# Altium footprint library PBL - SMD Packages.PcbLib: 263 footprints (part 14 of 17)
Each footprint in its own frame and in the unit in brackets; x right, y up, seen from the top. Pads: shape width x height; smd on the part's side, far side on the other; paste and mask are expansions set on the pad; w line width, h text height; cw(c..) or ccw(c..) is an arc to the next point about the centre after c.
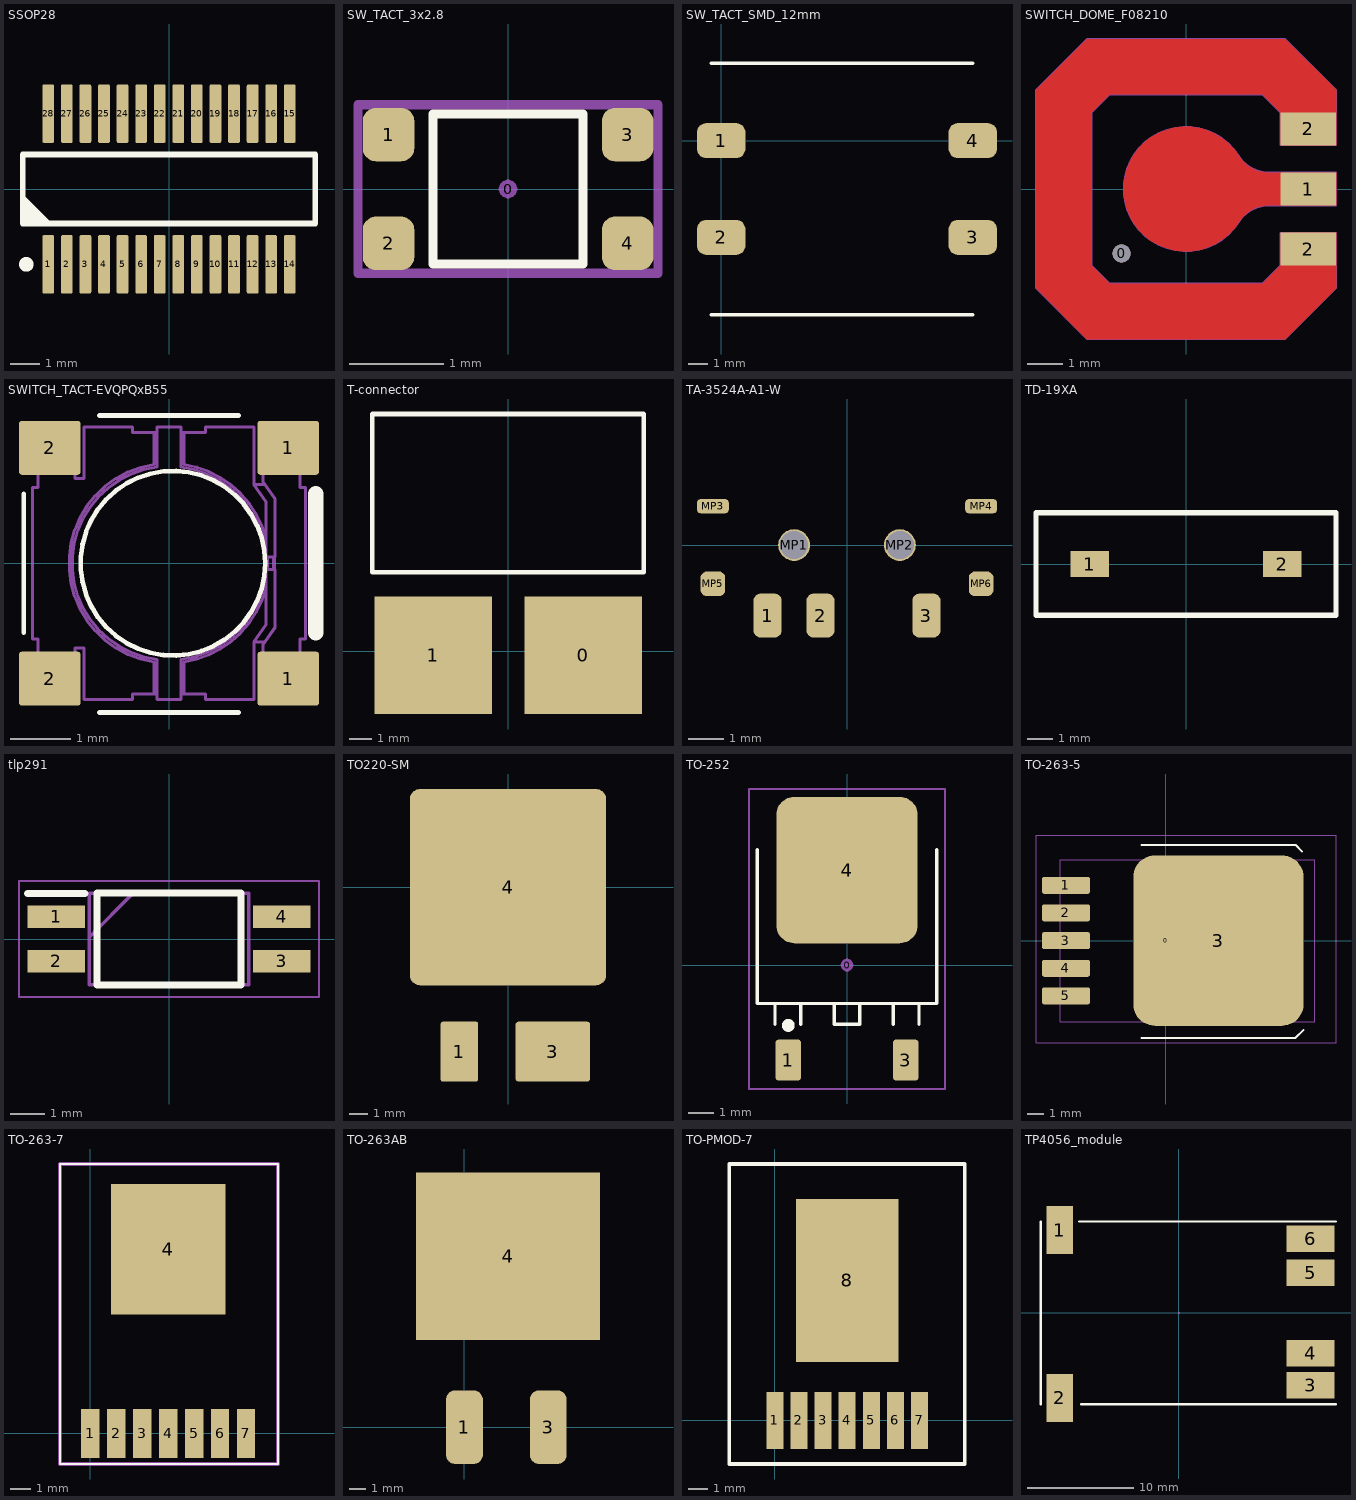
[diagram p13: the footprints below, top view; thin cyan lines are the x and y axes]

## SSOP28 [mm] "SSOP; 28 Leads; Body Width 3.9 mm; Pitch 0.635 mm"
height 1.75
pads (28):
  rrect25% 0.4x2 smd: 1(-4.127,-2.575) 2(-3.492,-2.575) 3(-2.857,-2.575) 4(-2.222,-2.575) 5(-1.587,-2.575) 6(-0.953,-2.575) 7(-0.318,-2.575) 8(0.318,-2.575) 9(0.953,-2.575) 10(1.587,-2.575) 11(2.222,-2.575) 12(2.857,-2.575) 13(3.492,-2.575) 14(4.127,-2.575) 15(4.127,2.575) 16(3.492,2.575) 17(2.857,2.575) 18(2.222,2.575) 19(1.587,2.575) 20(0.953,2.575) 21(0.318,2.575) 22(-0.318,2.575) 23(-0.953,2.575) 24(-1.587,2.575) 25(-2.222,2.575) 26(-2.857,2.575) 27(-3.492,2.575) 28(-4.127,2.575)
Top Overlay:
  circle w0.25: c-4.878,-2.575 r0.125
  region: -5,-1.175 -5,-0.175 -4,-1.175
  lines w0.2: -5,-1.175 -5,1.175 5,1.175 5,-1.175 -5,-1.175

## SW_TACT_3x2.8 [mm]
pads (5):
  round 0.2 on Mech15: 0(0,0)
  rrect50% 0.55x0.57 smd mask+0.05: 1(-1.274,0.58) 2(-1.274,-0.58) 3(1.276,0.58) 4(1.276,-0.58)
Top Overlay:
  lines w0.1: -0.8,-0.8 0.8,-0.8 0.8,0.8 -0.8,0.8 -0.8,-0.8
15 - Top Courtyards:
  lines w0.1: -1.6,-0.9 1.6,-0.9 1.6,0.9 -1.6,0.9 -1.6,-0.9

## SW_TACT_SMD_12mm [mm] "Tactile switch SMD 12x12mm"
pads (4):
  rrect50% 2.5x1.8 smd: 1(0,0) 2(0,-5) 3(13,-5) 4(13,0)
Top Overlay:
  lines w0.2: -0.5,-9 13,-9 ; -0.5,4 13,4
3D body "TACT SWITCH.STEP": height 7.78, standoff 0.18, extent 0.15,-8.423 12.85,3.577

## SWITCH_DOME_F08210 [mm] "Snaptron F08210 dome switch"
height 0.5
pads (4):
  round 0.508 hole 0.508 unplated: 0(-1.8,-1.8)
  rect 1.55x0.92 smd paste-0.8: 1(3.415,0) 2(3.415,-1.68) 2(3.415,1.68)
Top Layer:
  region: 1.472,-0.927 1.372,-1.086 1.109,-1.354 0.795,-1.559 0.444,-1.693 0.073,-1.749 -0.302,-1.724 -0.663,-1.62 -0.993,-1.441 -1.278,-1.196 -1.503,-0.896 -1.66,-0.555 -1.74,-0.188 -1.74,0.188 -1.66,0.555 -1.503,0.896 -1.278,1.196 -0.993,1.441 -0.663,1.62 -0.302,1.724 0.073,1.749 0.444,1.693 0.795,1.559 1.109,1.354 1.372,1.086 1.472,0.927 1.546,0.825 1.729,0.652 1.949,0.531 2.193,0.468 2.319,0.46 4.19,0.46 4.19,-0.46 2.319,-0.46 2.193,-0.468 1.949,-0.531 1.729,-0.652 1.546,-0.825
  region: -2.77,-4.19 -4.19,-2.77 -4.19,2.77 -2.77,4.19 2.77,4.19 4.19,2.77 4.19,1.22 2.64,1.22 2.64,2.128 2.128,2.64 -2.128,2.64 -2.64,2.128 -2.64,-2.128 -2.128,-2.64 2.128,-2.64 2.64,-2.128 2.64,-1.22 4.19,-1.22 4.19,-2.77 2.77,-4.19
Mechanical 3:
  lines w0.05: -4.19,-2.77 -2.77,-4.19 2.77,-4.19 4.19,-2.77 4.19,-1.22 2.64,-1.22 2.64,-2.128 2.128,-2.64 -2.128,-2.64 -2.64,-2.128 -2.64,2.128 -2.128,2.64 2.128,2.64 2.64,2.128 2.64,1.22 4.19,1.22 4.19,2.77 2.77,4.19 -2.77,4.19 -4.19,2.77 -4.19,-2.77 ; 1.472,-0.927 cw(c2.319,-1.46) 2.319,-0.46 4.19,-0.46 4.19,0.46 2.319,0.46 cw(c2.319,1.46) 1.472,0.927 ccw(c0,0) 1.472,-0.927
3D body "Snap Dome F08210.STEP": height 0.48, standoff 0, extent -3.546,-3.546 3.546,3.546

## SWITCH_TACT-EVQPQxB55 [mil] "Panasonic SMD tact switch 4.5x4.5x0.55mm, EVQPQxB55"
height 21.65
pads (4):
  rrect10% 40x35 smd: 1(77.5,-75) 1(77.5,75) 2(-77.5,-75) 2(-77.5,75)
Top Overlay:
  circle w3: c2.5,0 r60
  lines w3: -94.5,-45.28 -94.5,45.28 ; -45.28,-97 45.28,-97 ; -45.28,96 45.28,96
  lines w10: 95.5,-45.28 95.5,45.28
13 - 3D Top Side:
  lines w1.97: -85.04,-84.12 -61.02,-84.12 ; -85.04,-79.15 -61.02,-79.15 ; -85.04,-77.22 -61.02,-77.22 ; -85.04,-68.45 -61.02,-68.45 ; -85.04,-66.52 -61.02,-66.52 ; -85.04,-62.25 -61.02,-62.25 ; -85.04,-58.68 -61.02,-58.68 ; -85.04,58.68 -61.02,58.68 ; -85.04,62.25 -61.02,62.25 ; -85.04,66.52 -61.02,66.52 ; -85.04,68.45 -61.02,68.45 ; -85.04,77.22 -61.02,77.22 ; -85.04,79.15 -61.02,79.15 ; -85.04,84.12 -61.02,84.12 ; -9.84,-85.04 -9.84,-64.21 cw(c0,0) -9.84,64.21 -9.84,85.04 ; -7.87,-85.04 -23.62,-85.04 -23.62,-88.58 -55.12,-88.58 -55.12,-55.12 -61.02,-55.12 -61.02,-86.61 -85.04,-86.61 -85.04,-49.21 -88.58,-49.21 -88.58,49.21 -85.04,49.21 -85.04,86.61 -61.02,86.61 -61.02,55.12 -55.12,55.12 -55.12,88.58 -23.62,88.58 -23.62,85.04 -7.87,85.04 ; -7.87,-62.5 -7.87,-88.58 7.87,-88.58 7.87,-62.5 ; -7.87,62.5 -7.87,88.58 7.87,88.58 7.87,62.5 ; -7.81,-62.51 cw(c0,0) -7.81,62.51 ; 7.81,-62.51 ccw(c0,0) 7.81,62.51 ; 7.87,-85.04 23.62,-85.04 23.62,-88.58 55.12,-88.58 55.12,-51.29 62.99,-40.04 62.99,40.04 55.12,51.29 55.12,88.58 23.62,88.58 23.62,85.04 7.87,85.04 ; 9.84,-85.04 9.84,-64.21 ccw(c0,0) 62.99,-15.87 ; 9.84,85.04 9.84,64.21 cw(c0,0) 62.99,15.87 ; 55.19,-51.18 62.4,-51.18 ; 55.19,51.18 62.4,51.18 ; 61.02,-84.12 85.04,-84.12 ; 61.02,-79.15 85.04,-79.15 ; 61.02,-77.22 85.04,-77.22 ; 61.02,-68.45 85.04,-68.45 ; 61.02,-66.52 85.04,-66.52 ; 61.02,-62.25 85.04,-62.25 ; 61.02,-58.68 85.04,-58.68 ; 61.02,58.68 85.04,58.68 ; 61.02,62.25 85.04,62.25 ; 61.02,66.52 85.04,66.52 ; 61.02,68.45 85.04,68.45 ; 61.02,77.22 85.04,77.22 ; 61.02,79.15 85.04,79.15 ; 61.02,84.12 85.04,84.12 ; 64.09,-3.94 64.09,3.94 ; 67.8,-3.94 67.8,3.94 ; 68.44,-3.94 68.44,3.94 ; 61.02,-86.61 61.02,-53.15 68.9,-41.9 68.9,-3.94 63.45,-3.94 63.45,3.94 68.9,3.94 68.9,41.9 61.02,53.15 61.02,86.61 85.04,86.61 85.04,49.21 88.58,49.21 88.58,-49.21 85.04,-49.21 85.04,-86.61 61.02,-86.61
3D body "TACT_EVQ-PQHB55.STEP": height 21.65, standoff 0, extent -88.57,-88.58 88.59,88.59

## T-connector [mm]
pads (2):
  rect 5.2x5.2 smd: 0(3.325,-0.175) 1(-3.3,-0.175)
Top Overlay:
  lines w0.2: -6,3.5 6,3.5 6,10.5 -6,10.5 -6,3.5

## TA-3524A-A1-W [mm]
pads (9):
  rrect50% 0.8x1.25 smd mask+0.05: 1(-2.25,-2) 2(-0.75,-2) 3(2.25,-2)
  round 0.9 hole 0.8 mask+0.05: MP1(-1.5,0) MP2(1.5,0)
  rrect50% 0.9x0.4 smd mask+0.05: MP3(-3.8,1.1) MP4(3.8,1.1)
  rrect50% 0.7x0.7 smd mask+0.05: MP5(-3.8,-1.1) MP6(3.8,-1.1)
3D body "MA 12R Series Microminiature Memory Card Slide Switches.STEP": height 1.4, standoff -0.5, extent -3.85,-2.2 3.85,2.75

## TD-19XA [mm]
pads (2):
  rect 1.5x1 smd: 1(-3.75,0) 2(3.75,0)
Top Overlay:
  lines w0.2: -5.85,-2 5.85,-2 5.85,2 -5.85,2 -5.85,0 -5.85,-2
3D body: height 0.25, standoff 0, extent -3.81,-1.905 3.81,1.905

## tlp291 [mm]
pads (4):
  rect 1.65x0.65 smd: 1(-3.25,0.635) 2(-3.25,-0.635) 3(3.25,-0.635) 4(3.25,0.635)
Top Overlay:
  lines w0.2: -4.075,1.31 -2.425,1.31 ; -2.075,-1.325 2.075,-1.325 2.075,1.325 -2.075,1.325 -2.075,-1.325
13 - 3D Top Side:
  lines w0.1: -2.3,0.055 -1.03,1.325 ; -2.3,-1.325 2.3,-1.325 2.3,1.325 -2.3,1.325 -2.3,-1.325
15 - Top Courtyards:
  lines w0.05: -4.325,-1.675 4.325,-1.675 4.325,1.675 -4.325,1.675 -4.325,-1.675
3D body "TLP291_BLL,SE.stp": height 2.3, standoff 0, extent -3.5,-1.325 3.5,1.325

## TO220-SM [mm]
pads (3):
  rrect10% 2x3.2 smd: 1(-2.6,-8.8)
  rrect10% 4x3.2 smd: 3(2.4,-8.8)
  rrect10% 10.5x10.5 smd: 4(0,0)
3D body: height 3.3, standoff 0.2, extent -5,-5 5,5

## TO-252 [mm] "D-PAK/TO-252-AA; 3 Leads (1 Cropped); Body 10.3 (inc. leads) x 6.7 mm (LxW max)"
height 2.38
pads (4):
  round 0.5 on Mech15: 0(0,0)
  rrect25% 1x1.6 smd: 1(-2.285,-3.7) 3(2.285,-3.7)
  rrect25% 5.5x5.7 smd: 4(0,3.7)
Top Overlay:
  circle w0.25: c-2.285,-2.35 r0.125
  lines w0.127: -3.5,4.5 -3.5,-1.5 3.5,-1.5 3.5,4.5 ; -2.8,-2.3 -2.8,-1.5 -1.8,-1.5 -1.8,-2.3 ; 1.8,-2.3 1.8,-1.5 2.8,-1.5 2.8,-2.3 ; -0.5,-2.3 0.5,-2.3 0.5,-1.5 -0.5,-1.5 -0.5,-2.3
15 - Top Courtyards:
  lines w0.076: -3.81,-4.826 3.81,-4.826 3.81,6.858 -3.81,6.858 -3.81,-4.826
3D body "DPAK.stp": height 2.31, standoff 0, extent -3.3,-3.951 3.3,5.762

## TO-263-5 [mm] "D-PAK/TO-263-5; 5 Leads; Body 14.4 (inc. leads) x 10.4 mm (LxW max)"
height 4.65
pads (7):
  round 0.5 on Mech15: 0(0,0)
  rrect25% 2.95x1.05 smd: 1(-6.15,3.41) 2(-6.15,1.705) 3(-6.15,0) 4(-6.15,-1.705) 5(-6.15,-3.41)
  rrect25% 10.5x10.5 smd: 3(3.25,0)
Top Overlay:
  lines w0.127: -1.5,-6 8,-6 8.5,-5.5 ; -1.5,5.9 8,5.9 8.4,5.5
13 - 3D Top Side:
  lines w0.076: -6.49,-5 9.18,-5 9.18,5 -6.49,5 -6.49,-5
15 - Top Courtyards:
  lines w0.076: -8,-6.3 10.5,-6.3 10.5,6.5 -8,6.5 -8,-6.3
3D body "TO-263-5.stp": height 4.56, standoff 0, extent -6.727,-5.08 7.288,5.08

## TO-263-7 [mm]
pads (8):
  rect 0.9x2.4 smd mask+0.102: 1(0,0) 2(1.27,0) 3(2.54,0) 4(3.81,0) 5(5.08,0) 6(6.35,0) 7(7.62,0)
  rect 5.6x6.4 smd mask+0.102: 4(3.81,9.017)
Top Overlay:
  lines w0.1: -1.5,-1.5 -1.5,13.2 9.2,13.2 9.2,-1.5 -1.5,-1.5
Mechanical 3:
  lines w0.2: -1.5,-1.5 -1.5,13.2 9.2,13.2 9.2,-1.5 -1.5,-1.5
3D body "User Library-TO-PMOD-7-1.STEP": height 4.57, standoff 0, extent -1.27,-0.792 8.89,12.984

## TO-263AB [mm]
pads (3):
  rrect50% 2.2x4.4 smd: 1(0,0) 3(5,0)
  rect 11x10 smd: 4(2.6,10.2)
3D body "to-263.STEP": height 4.3, standoff 0, extent -2.4,-1.34 7.6,14.54

## TO-PMOD-7 [mm]
pads (8):
  rect 0.9x3 smd mask+0.102: 1(0,0) 2(1.27,0) 3(2.54,0) 4(3.81,0) 5(5.08,0) 6(6.35,0) 7(7.62,0)
  rect 5.4x8.6 smd mask+0.102: 8(3.81,7.366)
Top Overlay:
  lines w0.2: -2.4,-2.3 -2.4,13.5 10,13.5 10,-2.3 -2.4,-2.3
3D body "User Library-TO-PMOD-7-1.STEP": height 4.57, standoff 0, extent -1.27,-1.103 8.89,12.672

## TP4056_module [mm]
pads (7):
  round 0.2 on Mech15: 0(0,0)
  rect 2.5x4.5 smd mask+0.05: 1(-11.2,7.8) 2(-11.2,-8)
  rect 4.5x2.5 smd mask+0.05: 3(12.4,-6.8) 4(12.4,-3.8) 5(12.4,3.8) 6(12.4,7)
Top Overlay:
  lines w0.2: -13,-8.6 -13,8.6 ; -9.4,8.6 14.8,8.6 ; -9.2,-8.6 14.8,-8.6
3D body "Lipo Charger - With Load Protection.stp": height 4.28, standoff 0, extent -13.772,-8.547 13.132,8.547